# Altium footprint library OltestLib.PcbLib: 139 footprints (part 9 of 9)
Each footprint in its own frame and in the unit in brackets; x right, y up, seen from the top. Pads: shape width x height; smd on the part's side, far side on the other; paste and mask are expansions set on the pad; w line width, h text height; cw(c..) or ccw(c..) is an arc to the next point about the centre after c.
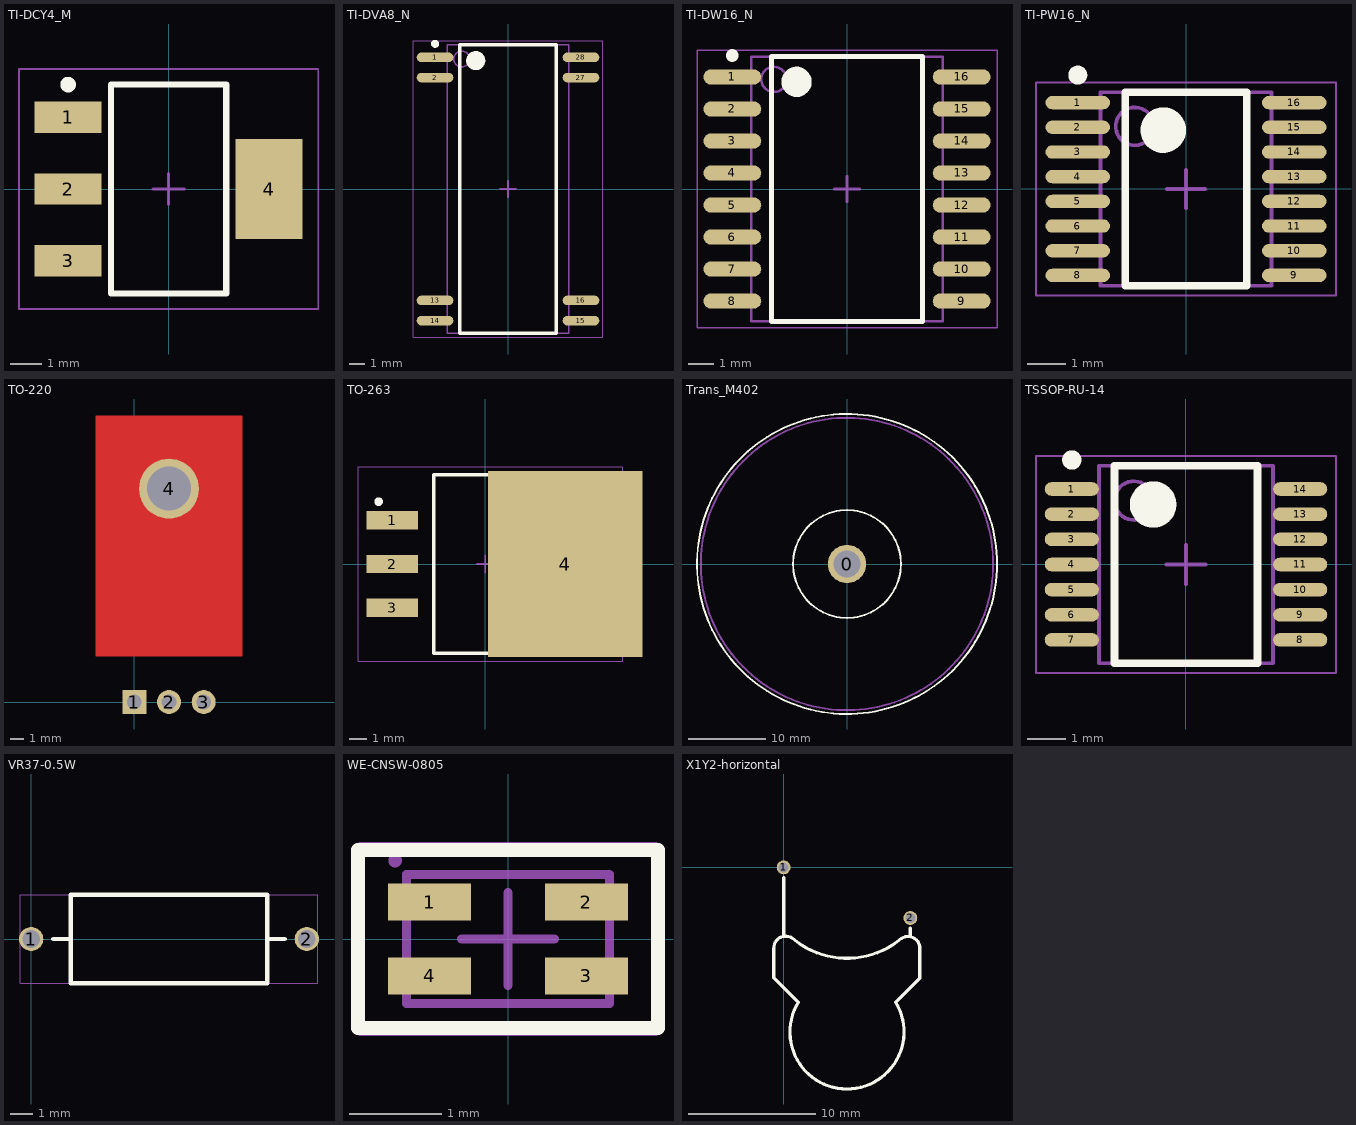
[diagram p8: the footprints below, top view; thin cyan lines are the x and y axes]

## TI-DCY4_M [mm] "SOT223, 4-Leads, Body 6.5x3.5mm, Pitch 2.3mm, IPC Low Density"
height 1.8
pads (4):
  rect 2.15x1 smd: 1(-3.225,2.3) 2(-3.225,0) 3(-3.225,-2.3)
  rect 2.15x3.2 smd: 4(3.225,0)
Top Overlay:
  circle w0.25: c-3.225,3.35 r0.125
  lines w0.2: -1.85,-3.35 1.85,-3.35 1.85,3.35 -1.85,3.35 -1.85,-3.35
Mechanical 13:
  lines w0.1: -1.85,-3.35 1.85,-3.35 1.85,3.35 -1.85,3.35 -1.85,-3.35
Mechanical 15:
  lines w0.05: -4.8,-3.85 4.8,-3.85 4.8,3.85 -4.8,3.85 -4.8,-3.85
  lines w0.1: -0.5,0 0.5,0 ; 0,-0.5 0,0.5
3D body "User Library-SOT-223-1.step": height 1.64, standoff -0.01, extent -3.5,-3.25 3.5,3.25

## TI-DVA8_N [mm] "SOIC, 8-Leads, Body 17.9x7.5mm, Pitch 1.27mm, IPC Medium Density"
height 2.65
pads (8):
  oval 2.3x0.6 smd: 1(-4.575,8.255) 2(-4.575,6.985) 13(-4.575,-6.985) 14(-4.575,-8.255) 15(4.575,-8.255) 16(4.575,-6.985) 27(4.575,6.985) 28(4.575,8.255)
Top Overlay:
  circle w0.25: c-4.575,9.105 r0.125
  circle w0.6: c-2.025,8.05 r0.3
  lines w0.2: -3.025,-9.05 -3.025,9.05 3.025,9.05 3.025,-9.05 -3.025,-9.05
Mechanical 13:
  circle w0.1: c-2.9,8.15 r0.5
  lines w0.1: -3.8,-9.05 -3.8,9.05 3.8,9.05 3.8,-9.05 -3.8,-9.05
Mechanical 15:
  lines w0.05: -5.95,-9.3 -5.95,9.3 5.95,9.3 5.95,-9.3 -5.95,-9.3
  lines w0.1: -0.5,0 0.5,0 ; 0,-0.5 0,0.5
3D body: height 2.65, standoff 0.1, extent -3.8,-9.05 3.8,9.05

## TI-DW16_N [mm] "SOIC, 16-Leads, Body 10.5x7.6mm, Pitch 1.27mm, IPC Medium Density"
height 2.65
pads (16):
  oval 2.3x0.6 smd: 1(-4.55,4.445) 2(-4.55,3.175) 3(-4.55,1.905) 4(-4.55,0.635) 5(-4.55,-0.635) 6(-4.55,-1.905) 7(-4.55,-3.175) 8(-4.55,-4.445) 9(4.55,-4.445) 10(4.55,-3.175) 11(4.55,-1.905) 12(4.55,-0.635) 13(4.55,0.635) 14(4.55,1.905) 15(4.55,3.175) 16(4.55,4.445)
Top Overlay:
  circle w0.6: c-2,4.25 r0.3
  circle w0.25: c-4.55,5.295 r0.125
  lines w0.2: -3,-5.25 3,-5.25 3,5.25 -3,5.25 -3,-5.25
Mechanical 13:
  circle w0.1: c-2.9,4.35 r0.5
  lines w0.1: -3.8,-5.25 3.8,-5.25 3.8,5.25 -3.8,5.25 -3.8,-5.25
Mechanical 15:
  lines w0.05: -5.95,-5.5 5.95,-5.5 5.95,5.5 -5.95,5.5 -5.95,-5.5
  lines w0.1: -0.5,0 0.5,0 ; 0,-0.5 0,0.5
3D body: height 2.65, standoff 0.1, extent -3.8,-5.25 3.8,5.25

## TI-PW16_N [mm] "SOP, 16-Leads, Body 5x4.4mm, Pitch 0.65mm, IPC Medium Density"
height 1.2
pads (16):
  oval 1.7x0.35 smd: 1(-2.85,2.275) 2(-2.85,1.625) 3(-2.85,0.975) 4(-2.85,0.325) 5(-2.85,-0.325) 6(-2.85,-0.975) 7(-2.85,-1.625) 8(-2.85,-2.275) 9(2.85,-2.275) 10(2.85,-1.625) 11(2.85,-0.975) 12(2.85,-0.325) 13(2.85,0.325) 14(2.85,0.975) 15(2.85,1.625) 16(2.85,2.275)
Top Overlay:
  circle w0.6: c-0.6,1.55 r0.3
  circle w0.25: c-2.85,3 r0.125
  lines w0.2: -1.6,-2.55 1.6,-2.55 1.6,2.55 -1.6,2.55 -1.6,-2.55
Mechanical 13:
  circle w0.1: c-1.35,1.65 r0.5
  lines w0.1: -2.25,-2.55 2.25,-2.55 2.25,2.55 -2.25,2.55 -2.25,-2.55
Mechanical 15:
  lines w0.05: -3.95,-2.8 3.95,-2.8 3.95,2.8 -3.95,2.8 -3.95,-2.8
  lines w0.1: -0.5,0 0.5,0 ; 0,-0.5 0,0.5
3D body: height 1.2, standoff 0.05, extent -2.25,-2.55 2.25,2.55

## TO-220 [mm] "TO-220, 4-pin"
height 4.7
pads (4):
  rect 1.8x1.8 hole 1.1 mask+0.128: 1(0,0)
  round 1.8 hole 1.1 mask+0.128: 2(2.6,0) 3(5.2,0)
  round 4.5 hole 3.3: 4(2.6,16)
Top Layer:
  rectangle: -2.9,3.4 8.1,21.5
Top Solder:
  rectangle: -3,3.3 8.2,21.6
3D body "SW3DPS-TO-220-DEFAULT.STEP": height 4.2, standoff -3, extent -2.48,-0.3 7.68,19.19

## TO-263 [mm] "DDPAK/TO-263 (3) 10.18 mm x 8.41 mm"
height 4.57
pads (4):
  rect 3x1.07 smd: 1(-5.4,2.54) 2(-5.4,0) 3(-5.4,-2.54)
  rect 9x10.8 smd: 4(4.65,0)
Top Overlay:
  circle w0.25: c-6.2,3.625 r0.125
  lines w0.2: 0.75,-5.2 -3,-5.2 -3,5.2 0.75,5.2
Mechanical 13:
  lines w0.1: -3,-5.2 5.9,-5.2 5.9,5.2 -3,5.2 -3,-5.2
Mechanical 15:
  lines w0.05: -7.4,-5.65 -7.4,5.65 8,5.65 8,-5.65 -7.4,-5.65
  lines w0.1: -0.5,0 0.5,0 ; 0,-0.5 0,0.5
3D body "User Library-DDPAK TO-263-3.step": height 4.87, standoff 0, extent -6.12,-5.08 8.11,5.08

## Trans_M402 [mm]
height 17
pads (1):
  round 5 hole 3.5: 0(0,0)
Top Overlay:
  circle w0.254: c0,0 r7
  circle w0.254: c0,0 r19.5
Mechanical 13:
  circle w0.254: c0,0 r19.007
3D body: height 17, standoff 0, extent -19.006,-19.006 19.006,19.006

## TSSOP-RU-14 [mm] "TSSOP, 14-Leads, Body 5,00x4,40mm, Pitch 0,65mm, IPC Medium Density"
height 1.2
pads (14):
  oval 1.4x0.35 smd: 1(-2.95,1.95) 2(-2.95,1.3) 3(-2.95,0.65) 4(-2.95,0) 5(-2.95,-0.65) 6(-2.95,-1.3) 7(-2.95,-1.95) 8(2.95,-1.95) 9(2.95,-1.3) 10(2.95,-0.65) 11(2.95,0) 12(2.95,0.65) 13(2.95,1.3) 14(2.95,1.95)
Top Overlay:
  circle w0.6: c-0.85,1.55 r0.3
  circle w0.25: c-2.95,2.7 r0.125
  lines w0.2: -1.85,-2.55 1.85,-2.55 1.85,2.55 -1.85,2.55 -1.85,-2.55
Mechanical 13:
  circle w0.1: c-1.35,1.65 r0.5
  lines w0.1: -2.25,-2.55 2.25,-2.55 2.25,2.55 -2.25,2.55 -2.25,-2.55
Mechanical 15:
  lines w0.05: -3.875,-2.8 3.875,-2.8 3.875,2.8 -3.875,2.8 -3.875,-2.8
  lines w0.1: -0.5,0 0.5,0 ; 0,-0.5 0,0.5
3D body "TSSOP-RU-14.step": height 1.2, standoff 0, extent -3.2,-2.55 3.2,2.55

## VR37-0.5W [mm] "Axial 0.5W"
height 5
pads (2):
  round 1.1 hole 0.8: 1(0,0) 2(12.5,0)
Top Overlay:
  lines w0.2: 1,0 1.8,0 ; 10.7,0 11.5,0 ; 1.8,-2 1.8,-0.725 1.8,2 10.7,2 10.7,-2 1.8,-2
Mechanical 13:
  lines w0.05: -0.5,-2 13,-2 13,2 -0.5,2 -0.5,-2
3D body "User Library-res_05x12_5.STEP": height 3.6, standoff -1.8, extent -0.3,-1.6 12.8,1.6

## WE-CNSW-0805 [mm] "SMD Inductor, 4-Leads, Body 1.4x2.2x1.4 mm"
height 1.4
pads (4):
  rect 0.9x0.4 smd: 1(-0.85,0.4) 2(0.85,0.4) 3(0.85,-0.4) 4(-0.85,-0.4)
Top Overlay:
  lines w0.152: -1.626,-0.965 -1.626,0.965 1.626,0.965 1.626,-0.965 -1.626,-0.965
Mechanical 13:
  circle w0.1: c-1.224,0.85 r0.024
  lines w0.1: -1.1,-0.7 1.1,-0.7 1.1,0.7 -1.1,0.7 -1.1,-0.7
Mechanical 15:
  lines w0.1: -0.5,0 0.5,0 ; 0,-0.5 0,0.5 ; -1.6,-1 1.6,-1 1.6,1 -1.6,1 -1.6,-1
3D body "744231371.stp": height 1.18, standoff -0.02, extent -1,-0.6 1,0.6

## X1Y2-horizontal [mm] "Capacitor"
height 14
pads (2):
  round 1.1 hole 0.8: 1(0,0) 2(10,-4)
Top Overlay:
  lines w0.254: 0,-5.4 0,-0.8 ; 0.667,-5.588 ccw(c0.156,-6.366) -0.775,-6.378 -0.775,-8.728 1.124,-10.628 ; 0.692,-5.609 ccw(c5,-0.5) 9.308,-5.609 cw(c9.819,-6.388) 10.75,-6.4 10.75,-8.75 8.851,-10.649 8.851,-10.672 cw(c5,-13) 1.162,-10.651 ; 10,-5.4 10,-4.8
Mechanical 13:
  lines w0.2: 9.4,-10.1 10.75,-8.75
3D body: height 4, standoff 0, extent 0.559,-17.441 9.441,-8.559
3D body: height 4, standoff 0, extent -0.9,-8.8 11,-5.3